# Altium schematic symbol library FPGA_Xilinx_Virtex7.SchLib: 34 symbols (part 34 of 34) (continued)
## XC7VX1140T-FLG1930 (continued)
part H pins: A27 VCCO_33 (power), A28 IO_L20P_T3_33 (io), A29 IO_L20N_T3_33 (io), A30 IO_L24N_T3_33 (io), AJ12 IO_L1P_T0_32 (io), AJ13 VCCO_32 (power), AK11 IO_0_VRN_32 (io), AK12 IO_L1N_T0_32 (io), AK13 IO_L2P_T0_32 (io), AL10 IO_L4N_T0_32 (io), AL11 IO_L4P_T0_32 (io), AL13 IO_L2N_T0_32 (io), AM10 IO_L6N_T0_VREF_32 (io), AM11 IO_L6P_T0_32 (io), AM12 IO_L3P_T0_DQS_32 (io), AM13 IO_L5P_T0_32 (io), AN10 IO_L8P_T1_32 (io), AN11 VCCO_32 (power), AN12 IO_L3N_T0_DQS_32 (io), AN13 IO_L5N_T0_32 (io), AN14 IO_25_VRP_32 (io), AP10 IO_L8N_T1_32 (io), AP11 IO_L10P_T1_32 (io), AP12 IO_L7P_T1_32 (io), AR11 IO_L10N_T1_32 (io), AR12 IO_L7N_T1_32 (io), AR13 IO_L9P_T1_DQS_32 (io), AT10 IO_L12N_T1_MRCC_32 (io), AT11 IO_L12P_T1_MRCC_32 (io), AT12 VCCO_32 (power), AT13 IO_L9N_T1_DQS_32 (io), AU10 IO_L13N_T2_MRCC_32 (io), AU11 IO_L13P_T2_MRCC_32 (io), AU12 IO_L11N_T1_SRCC_32 (io), AU13 IO_L11P_T1_SRCC_32 (io), AV10 IO_L15P_T2_DQS_32 (io), AV12 IO_L14N_T2_SRCC_32 (io), AV13 IO_L14P_T2_SRCC_32 (io), AW10 IO_L15N_T2_DQS_32 (io), AW11 IO_L17P_T2_32 (io), AW12 IO_L16P_T2_32 (io), AW13 VCCO_32 (power), AY10 VCCO_32 (power), AY11 IO_L17N_T2_32 (io), AY12 IO_L16N_T2_32 (io), AY13 IO_L18P_T2_32 (io), B27 IO_L23P_T3_33 (io), B28 IO_L23N_T3_33 (io), B30 IO_L24P_T3_33 (io), BA10 IO_L19N_T3_VREF_32 (io), BA11 IO_L19P_T3_32 (io), BA13 IO_L18N_T2_32 (io), BB10 IO_L21N_T3_DQS_32 (io), BB11 IO_L21P_T3_DQS_32 (io), BB12 IO_L20N_T3_32 (io), BB13 IO_L20P_T3_32 (io), BC10 IO_L23P_T3_32 (io), BC11 VCCO_32 (power), BC12 IO_L22N_T3_32 (io), BC13 IO_L22P_T3_32 (io), BD10 IO_L23N_T3_32 (io), BD11 IO_L24N_T3_32 (io), BD12 IO_L24P_T3_32 (io), C27 IO_L21P_T3_DQS_33 (io), C28 IO_L21N_T3_DQS_33 (io), C29 IO_L22P_T3_33 (io), C30 IO_L22N_T3_33 (io), D27 IO_L15N_T2_DQS_33 (io), D28 VCCO_33 (power), D29 IO_L19P_T3_33 (io), D30 IO_L19N_T3_VREF_33 (io), E27 IO_L15P_T2_DQS_33 (io), E28 IO_L17N_T2_33 (io), E29 IO_L16N_T2_33 (io), F28 IO_L17P_T2_33 (io), F29 IO_L16P_T2_33 (io), F30 IO_L18N_T2_33 (io), G27 IO_L14P_T2_SRCC_33 (io), G28 IO_L14N_T2_SRCC_33 (io), G29 VCCO_33 (power), G30 IO_L18P_T2_33 (io), H27 IO_L13P_T2_MRCC_33 (io), H28 IO_L13N_T2_MRCC_33 (io), H29 IO_L12P_T1_MRCC_33 (io), H30 IO_L12N_T1_MRCC_33 (io), J27 IO_L10N_T1_33 (io), J29 IO_L11P_T1_SRCC_33 (io), J30 IO_L11N_T1_SRCC_33 (io), K27 IO_L10P_T1_33 (io), K28 IO_L8N_T1_33 (io), K29 IO_L9N_T1_DQS_33 (io), K30 VCCO_33 (power), L27 VCCO_33 (power), L28 IO_L8P_T1_33 (io), L29 IO_L9P_T1_DQS_33 (io), M27 IO_L7P_T1_33 (io), M28 IO_L7N_T1_33 (io), N27 IO_L5P_T0_33 (io), N28 IO_L5N_T0_33 (io), N29 IO_25_VRP_33 (io), P26 IO_L4P_T0_33 (io), P27 IO_L4N_T0_33 (io), P28 VCCO_33 (power), P29 IO_L3N_T0_DQS_33 (io), R26 IO_L2N_T0_33 (io), R27 IO_L6P_T0_33 (io), R28 IO_L6N_T0_VREF_33 (io), R29 IO_L3P_T0_DQS_33 (io), T26 IO_L2P_T0_33 (io), T28 IO_L1P_T0_33 (io), T29 IO_L1N_T0_33 (io), U26 IO_0_VRN_33 (io), U29 VCCO_33 (power)
part I pins: A20 IO_L24N_T3_35 (io), A21 IO_L24P_T3_35 (io), A23 IO_L23N_T3_35 (io), A24 IO_L21P_T3_DQS_34 (io), A25 IO_L21N_T3_DQS_34 (io), A26 IO_L23N_T3_34 (io), B20 IO_L20N_T3_35 (io), B21 IO_L22N_T3_35 (io), B22 IO_L21N_T3_DQS_35 (io), B23 IO_L23P_T3_35 (io), B24 VCCO_34 (power), B25 IO_L24N_T3_34 (io), B26 IO_L23P_T3_34 (io), C20 IO_L20P_T3_35 (io), C21 VCCO_35 (power), C22 IO_L22P_T3_35 (io), C23 IO_L21P_T3_DQS_35 (io), C24 IO_L24P_T3_34 (io), C25 IO_L22N_T3_34 (io), D20 IO_L19N_T3_VREF_35 (io), D21 IO_L19P_T3_35 (io), D22 IO_L18N_T2_35 (io), D24 IO_L20N_T3_34 (io), D25 IO_L22P_T3_34 (io), D26 IO_L19N_T3_VREF_34 (io), E21 IO_L16N_T2_35 (io), E22 IO_L16P_T2_35 (io), E23 IO_L18P_T2_35 (io), E24 IO_L20P_T3_34 (io), E25 VCCO_34 (power), E26 IO_L19P_T3_34 (io), F20 IO_L15N_T2_DQS_35 (io), F21 IO_L17N_T2_35 (io), F22 VCCO_35 (power), F23 IO_L17N_T2_34 (io), F24 IO_L16P_T2_34 (io), F25 IO_L16N_T2_34 (io), F26 IO_L18N_T2_34 (io), G20 IO_L15P_T2_DQS_35 (io), G21 IO_L17P_T2_35 (io), G22 IO_L14N_T2_SRCC_35 (io), G23 IO_L17P_T2_34 (io), G25 IO_L15N_T2_DQS_34 (io), G26 IO_L18P_T2_34 (io), H20 IO_L13N_T2_MRCC_35 (io), H22 IO_L14P_T2_SRCC_35 (io), H23 IO_L13P_T2_MRCC_34 (io), H24 IO_L13N_T2_MRCC_34 (io), H25 IO_L15P_T2_DQS_34 (io), H26 VCCO_34 (power), J20 IO_L13P_T2_MRCC_35 (io), J21 IO_L12N_T1_MRCC_35 (io), J22 IO_L11N_T1_SRCC_35 (io), J23 VCCO_34 (power), J24 IO_L12N_T1_MRCC_34 (io), J25 IO_L14P_T2_SRCC_34 (io), J26 IO_L14N_T2_SRCC_34 (io), K20 VCCO_35 (power), K21 IO_L12P_T1_MRCC_35 (io), K22 IO_L11P_T1_SRCC_35 (io), K23 IO_L10N_T1_34 (io), K24 IO_L12P_T1_MRCC_34 (io), K26 IO_L11N_T1_SRCC_34 (io), L19 IO_L9N_T1_DQS_AD7N_35 (io), L20 IO_L9P_T1_DQS_AD7P_35 (io), L21 IO_L10N_T1_AD15N_35 (io), L23 IO_L10P_T1_34 (io), L24 IO_L7P_T1_34 (io), L25 IO_L7N_T1_34 (io), L26 IO_L11P_T1_SRCC_34 (io), M20 IO_L8N_T1_AD14N_35 (io), M21 IO_L10P_T1_AD15P_35 (io), M22 IO_L7N_T1_AD6N_35 (io), M23 IO_L8N_T1_34 (io), M24 VCCO_34 (power), M25 IO_L9P_T1_DQS_34 (io), M26 IO_L9N_T1_DQS_34 (io), N19 IO_L6N_T0_VREF_35 (io), N20 IO_L8P_T1_AD14P_35 (io), N21 VCCO_35 (power), N22 IO_L7P_T1_AD6P_35 (io), N23 IO_L8P_T1_34 (io), N24 IO_L1N_T0_34 (io), N25 IO_25_VRP_34 (io), P18 VCCO_35 (power), P19 IO_L4N_T0_35 (io), P20 IO_L6P_T0_35 (io), P21 IO_25_VRP_35 (io), P22 IO_L4N_T0_34 (io), P24 IO_L1P_T0_34 (io), P25 IO_L3N_T0_DQS_34 (io), R18 IO_L2N_T0_AD12N_35 (io), R19 IO_L4P_T0_35 (io), R21 IO_L5N_T0_AD13N_35 (io), R22 IO_L4P_T0_34 (io), R23 IO_L2N_T0_34 (io), R24 IO_L3P_T0_DQS_34 (io), R25 VCCO_34 (power), T18 IO_L2P_T0_AD12P_35 (io), T19 IO_L1N_T0_AD4N_35 (io), T20 IO_L1P_T0_AD4P_35 (io), T21 IO_L5P_T0_AD13P_35 (io), T22 VCCO_34 (power), T23 IO_L2P_T0_34 (io), T24 IO_L6N_T0_VREF_34 (io), T25 IO_L5N_T0_34 (io), U18 IO_0_VRN_35 (io), U19 VCCO_35 (power), U20 IO_L3N_T0_DQS_AD5N_35 (io), U21 IO_L3P_T0_DQS_AD5P_35 (io), U22 IO_0_VRN_34 (io), U23 IO_L6P_T0_34 (io), U25 IO_L5P_T0_34 (io)
part J pins: A3 IO_L1N_T0_36 (io), A4 IO_L1P_T0_36 (io), A5 IO_L4N_T0_36 (io), A6 IO_L2N_T0_36 (io), A7 VCCO_37 (power), A8 IO_L2N_T0_37 (io), A9 IO_L2P_T0_37 (io), A10 IO_L3N_T0_DQS_37 (io), A11 IO_L1N_T0_37 (io), B2 IO_L5N_T0_36 (io), B3 IO_L3N_T0_DQS_36 (io), B4 VCCO_36 (power), B5 IO_L4P_T0_36 (io), B6 IO_L2P_T0_36 (io), B7 IO_L4N_T0_37 (io), B8 IO_L4P_T0_37 (io), B10 IO_L3P_T0_DQS_37 (io), B11 IO_L1P_T0_37 (io), C1 VCCO_36 (power), C2 IO_L5P_T0_36 (io), C3 IO_L3P_T0_DQS_36 (io), C4 IO_L6N_T0_VREF_36 (io), C5 IO_L6P_T0_36 (io), C7 IO_L6N_T0_VREF_37 (io), C8 IO_L6P_T0_37 (io), C9 IO_L5N_T0_37 (io), C10 IO_L5P_T0_37 (io), C11 VCCO_37 (power), D1 IO_L7N_T1_36 (io), D2 IO_L7P_T1_36 (io), D4 IO_L10N_T1_36 (io), D5 IO_L8N_T1_36 (io), D6 IO_L10N_T1_37 (io), D7 IO_L10P_T1_37 (io), D8 VCCO_37 (power), D9 IO_L9N_T1_DQS_37 (io), D10 IO_L9P_T1_DQS_37 (io), D11 IO_L7N_T1_37 (io), E1 IO_L9N_T1_DQS_36 (io), E2 IO_L12N_T1_MRCC_36 (io), E3 IO_L12P_T1_MRCC_36 (io), E4 IO_L10P_T1_36 (io), E5 VCCO_36 (power), E6 IO_L8P_T1_36 (io), E7 IO_L12N_T1_MRCC_37 (io), E8 IO_L8N_T1_37 (io), E9 IO_L8P_T1_37 (io), E11 IO_L7P_T1_37 (io), F1 IO_L9P_T1_DQS_36 (io), F2 VCCO_36 (power), F3 IO_L11N_T1_SRCC_36 (io), F4 IO_L11P_T1_SRCC_36 (io), F5 IO_L13N_T2_MRCC_36 (io), F6 IO_L13P_T2_MRCC_36 (io), F8 IO_L12P_T1_MRCC_37 (io), F9 IO_L11N_T1_SRCC_37 (io), F10 IO_L11P_T1_SRCC_37 (io), F11 IO_L13N_T2_MRCC_37 (io), G1 IO_L18N_T2_36 (io), G2 IO_L14N_T2_SRCC_36 (io), G3 IO_L14P_T2_SRCC_36 (io), G5 IO_L15N_T2_DQS_36 (io), G6 IO_L15P_T2_DQS_36 (io), G7 IO_L14N_T2_SRCC_37 (io), G8 IO_L14P_T2_SRCC_37 (io), G9 VCCO_37 (power), G10 IO_L16N_T2_37 (io), G11 IO_L13P_T2_MRCC_37 (io), H2 IO_L18P_T2_36 (io), H3 IO_L16N_T2_36 (io), H4 IO_L16P_T2_36 (io), H5 IO_L17N_T2_36 (io), H6 VCCO_36 (power), H7 IO_L17N_T2_37 (io), H8 IO_L17P_T2_37 (io), H9 IO_L15N_T2_DQS_37 (io), H10 IO_L16P_T2_37 (io), J1 IO_L20N_T3_36 (io), J2 IO_L20P_T3_36 (io), J3 VCCO_36 (power), J4 IO_L19N_T3_VREF_36 (io), J5 IO_L19P_T3_36 (io), J6 IO_L17P_T2_36 (io), J7 IO_L20N_T3_37 (io), J9 IO_L15P_T2_DQS_37 (io), J10 IO_L18N_T2_37 (io), J11 IO_L18P_T2_37 (io), K1 IO_L22N_T3_36 (io), K2 IO_L23N_T3_36 (io), K3 IO_L21N_T3_DQS_36 (io), K4 IO_L21P_T3_DQS_36 (io), K6 IO_0_VRN_36 (io), K7 IO_L20P_T3_37 (io), K8 IO_L19N_T3_VREF_37 (io), K9 IO_L19P_T3_37 (io), K10 VCCO_37 (power), K11 IO_0_VRN_37 (io), L1 IO_L22P_T3_36 (io), L3 IO_L23P_T3_36 (io), L4 IO_25_VRP_36 (io), L5 IO_L24N_T3_36 (io), L6 IO_L24P_T3_36 (io), L7 VCCO_37 (power), L8 IO_L22N_T3_37 (io), L9 IO_L22P_T3_37 (io), L10 IO_L21N_T3_DQS_37 (io), L11 IO_L21P_T3_DQS_37 (io), M8 IO_25_VRP_37 (io), M10 IO_L23N_T3_37 (io), M11 IO_L23P_T3_37 (io), N10 IO_L24N_T3_37 (io), N11 VCCO_37 (power), P10 IO_L24P_T3_37 (io)
part K pins: A13 IO_L3N_T0_DQS_38 (io), A14 IO_L3P_T0_DQS_38 (io), A15 IO_L24N_T3_39 (io), A16 IO_L24P_T3_39 (io), A17 VCCO_39 (power), A18 IO_L23N_T3_39 (io), A19 IO_L23P_T3_39 (io), B12 IO_L2N_T0_38 (io), B13 IO_L5N_T0_38 (io), B14 VCCO_38 (power), B15 IO_L20N_T3_39 (io), B16 IO_L22N_T3_39 (io), B17 IO_L21N_T3_DQS_39 (io), B18 IO_L21P_T3_DQS_39 (io), C12 IO_L2P_T0_38 (io), C13 IO_L5P_T0_38 (io), C14 IO_L1N_T0_38 (io), C15 IO_L20P_T3_39 (io), C17 IO_L22P_T3_39 (io), C18 IO_L19N_T3_VREF_39 (io), C19 IO_L19P_T3_39 (io), D12 IO_L4N_T0_38 (io), D14 IO_L1P_T0_38 (io), D15 IO_L18N_T2_39 (io), D16 IO_L18P_T2_39 (io), D17 IO_L16N_T2_39 (io), D18 VCCO_39 (power), D19 IO_L17N_T2_39 (io), E12 IO_L4P_T0_38 (io), E13 IO_L6N_T0_VREF_38 (io), E14 IO_L6P_T0_38 (io), E15 VCCO_38 (power), E16 IO_L13N_T2_MRCC_39 (io), E17 IO_L16P_T2_39 (io), E18 IO_L15N_T2_DQS_39 (io), E19 IO_L17P_T2_39 (io), F12 VCCO_38 (power), F13 IO_L9N_T1_DQS_38 (io), F14 IO_L9P_T1_DQS_38 (io), F15 IO_L7N_T1_38 (io), F16 IO_L13P_T2_MRCC_39 (io), F18 IO_L14N_T2_SRCC_39 (io), F19 IO_L15P_T2_DQS_39 (io), G12 IO_L8N_T1_38 (io), G13 IO_L8P_T1_38 (io), G15 IO_L7P_T1_38 (io), G16 IO_L12N_T1_MRCC_39 (io), G17 IO_L12P_T1_MRCC_39 (io), G18 IO_L14P_T2_SRCC_39 (io), G19 VCCO_39 (power), H12 IO_L11N_T1_SRCC_38 (io), H13 IO_L11P_T1_SRCC_38 (io), H14 IO_L10N_T1_38 (io), H15 IO_L10P_T1_38 (io), H16 VCCO_39 (power), H17 IO_L11N_T1_SRCC_39 (io), H18 IO_L11P_T1_SRCC_39 (io), H19 IO_L10N_T1_39 (io), J12 IO_L14N_T2_SRCC_38 (io), J13 VCCO_38 (power), J14 IO_L12N_T1_MRCC_38 (io), J15 IO_L12P_T1_MRCC_38 (io), J16 IO_L7N_T1_39 (io), J17 IO_L7P_T1_39 (io), J19 IO_L10P_T1_39 (io), K12 IO_L14P_T2_SRCC_38 (io), K13 IO_L13N_T2_MRCC_38 (io), K14 IO_L13P_T2_MRCC_38 (io), K16 IO_L8N_T1_39 (io), K17 IO_L8P_T1_39 (io), K18 IO_L9N_T1_DQS_39 (io), K19 IO_L9P_T1_DQS_39 (io), L13 IO_L16N_T2_38 (io), L14 IO_L16P_T2_38 (io), L15 IO_L15N_T2_DQS_38 (io), L16 IO_L2N_T0_39 (io), L17 VCCO_39 (power), L18 IO_0_VRN_39 (io), M12 IO_L18N_T2_38 (io), M13 IO_L18P_T2_38 (io), M14 VCCO_38 (power), M15 IO_L15P_T2_DQS_38 (io), M16 IO_L2P_T0_39 (io), M17 IO_L1N_T0_39 (io), M18 IO_L1P_T0_39 (io), N12 IO_L19N_T3_VREF_38 (io), N13 IO_L19P_T3_38 (io), N14 IO_L17N_T2_38 (io), N15 IO_L17P_T2_38 (io), N17 IO_L3N_T0_DQS_39 (io), N18 IO_L3P_T0_DQS_39 (io), P11 IO_L20N_T3_38 (io), P12 IO_L20P_T3_38 (io), P14 IO_L21N_T3_DQS_38 (io), P15 IO_0_VRN_38 (io), P16 IO_L5N_T0_39 (io), P17 IO_L6N_T0_VREF_39 (io), R11 IO_25_VRP_38 (io), R12 IO_L22N_T3_38 (io), R13 IO_L22P_T3_38 (io), R14 IO_L21P_T3_DQS_38 (io), R15 VCCO_39 (power), R16 IO_L5P_T0_39 (io), R17 IO_L6P_T0_39 (io), T12 VCCO_38 (power), T13 IO_L23N_T3_38 (io), T14 IO_L23P_T3_38 (io), T15 IO_L24N_T3_38 (io), T16 IO_L4N_T0_39 (io), U15 IO_L24P_T3_38 (io), U16 IO_L4P_T0_39 (io), U17 IO_25_VRP_39 (io)
part L pins: AP3 MGTHTXN3_114 (io), AP4 MGTHTXP3_114 (io), AR1 MGTHTXN2_114 (io), AR2 MGTHTXP2_114 (io), AR5 MGTHRXN3_114 (io), AR6 MGTHRXP3_114 (io), AT3 MGTHRXN2_114 (io), AT4 MGTHRXP2_114 (io), AT7 MGTREFCLK0N_114 (io), AT8 MGTREFCLK0P_114 (io), AU1 MGTHTXN1_114 (io), AU2 MGTHTXP1_114 (io), AU5 MGTHRXN1_114 (io), AU6 MGTHRXP1_114 (io), AV3 MGTHTXN0_114 (io), AV4 MGTHTXP0_114 (io), AV7 MGTREFCLK1N_114 (io), AV8 MGTREFCLK1P_114 (io), AW1 MGTHTXN3_113 (io), AW2 MGTHTXP3_113 (io), AW5 MGTHRXN0_114 (io), AW6 MGTHRXP0_114 (io), AY3 MGTHRXN3_113 (io), AY4 MGTHRXP3_113 (io), AY7 MGTREFCLK0N_113 (io), AY8 MGTREFCLK0P_113 (io), BA1 MGTHTXN2_113 (io), BA2 MGTHTXP2_113 (io), BA5 MGTHRXN2_113 (io), BA6 MGTHRXP2_113 (io), BB3 MGTHTXN1_113 (io), BB4 MGTHTXP1_113 (io), BB7 MGTREFCLK1N_113 (io), BB8 MGTREFCLK1P_113 (io), BC5 MGTHRXN1_113 (io), BC6 MGTHRXP1_113 (io), BD3 MGTHTXN0_113 (io), BD4 MGTHTXP0_113 (io), BD7 MGTHRXN0_113 (io), BD8 MGTHRXP0_113 (io)
part M pins: AC1 MGTHTXN3_116 (io), AC2 MGTHTXP3_116 (io), AC5 MGTHRXN3_116 (io), AC6 MGTHRXP3_116 (io), AD7 MGTREFCLK0N_116 (io), AD8 MGTREFCLK0P_116 (io), AE1 MGTHTXN2_116 (io), AE2 MGTHTXP2_116 (io), AE5 MGTHRXN2_116 (io), AE6 MGTHRXP2_116 (io), AF3 MGTHTXN1_116 (io), AF4 MGTHTXP1_116 (io), AF7 MGTREFCLK1N_116 (io), AF8 MGTREFCLK1P_116 (io), AG1 MGTHTXN0_116 (io), AG2 MGTHTXP0_116 (io), AG5 MGTHRXN0_116 (io), AG6 MGTHRXP0_116 (io), AH3 MGTHRXN1_116 (io), AH4 MGTHRXP1_116 (io), AJ1 MGTHTXN3_115 (io), AJ2 MGTHTXP3_115 (io), AJ5 MGTHRXN3_115 (io), AJ6 MGTHRXP3_115 (io), AK3 MGTHTXN2_115 (io), AK4 MGTHTXP2_115 (io), AL1 MGTHTXN1_115 (io), AL2 MGTHTXP1_115 (io), AL5 MGTHRXN1_115 (io), AL6 MGTHRXP1_115 (io), AM3 MGTHRXN2_115 (io), AM4 MGTHRXP2_115 (io), AM7 MGTREFCLK0N_115 (io), AM8 MGTREFCLK0P_115 (io), AN1 MGTHTXN0_115 (io), AN2 MGTHTXP0_115 (io), AN5 MGTHRXN0_115 (io), AN6 MGTHRXP0_115 (io), AP7 MGTREFCLK1N_115 (io), AP8 MGTREFCLK1P_115 (io)
part N pins: AA1 MGTHTXN1_117 (io), AA2 MGTHTXP1_117 (io), AA5 MGTHRXN1_117 (io), AA6 MGTHRXP1_117 (io), AB3 MGTHTXN0_117 (io), AB4 MGTHTXP0_117 (io), AB7 MGTREFCLK1N_117 (io), AB8 MGTREFCLK1P_117 (io), AD3 MGTHRXN0_117 (io), AD4 MGTHRXP0_117 (io), N1 MGTHTXN3_118 (io), N2 MGTHTXP3_118 (io), N5 MGTHRXN3_118 (io), N6 MGTHRXP3_118 (io), P3 MGTHTXN2_118 (io), P4 MGTHTXP2_118 (io), R1 MGTHTXN1_118 (io), R2 MGTHTXP1_118 (io), R5 MGTHRXN2_118 (io), R6 MGTHRXP2_118 (io), T3 MGTHRXN1_118 (io), T4 MGTHRXP1_118 (io), T7 MGTREFCLK0N_118 (io), T8 MGTREFCLK0P_118 (io), U1 MGTHTXN0_118 (io), U2 MGTHTXP0_118 (io), U5 MGTHRXN0_118 (io), U6 MGTHRXP0_118 (io), V3 MGTHTXN3_117 (io), V4 MGTHTXP3_117 (io), V7 MGTREFCLK1N_118 (io), V8 MGTREFCLK1P_118 (io), W1 MGTHTXN2_117 (io), W2 MGTHTXP2_117 (io), W5 MGTHRXN3_117 (io), W6 MGTHRXP3_117 (io), Y3 MGTHRXN2_117 (io), Y4 MGTHRXP2_117 (io), Y7 MGTREFCLK0N_117 (io), Y8 MGTREFCLK0P_117 (io)
part O pins: AB2 MGTAVTT_G11 (power), AB6 MGTAVCC_G11 (power), AC4 MGTAVTT_G11 (power), AC8 MGTAVCC_G11 (power), AF2 MGTAVTT_G11 (power), AF6 MGTAVCC_G11 (power), AG4 MGTAVTT_G11 (power), AG8 MGTVCCAUX_G11 (power), AH6 MGTAVCC_G11 (power), AJ8 MGTVCCAUX_G10 (power), AK2 MGTAVTT_G10 (power), AK6 MGTAVCC_G10 (power), AK7 MGTAVTTRCAL_115 (power), AK8 MGTRREF_115 (power), AL4 MGTAVTT_G10 (power), AL8 MGTAVCC_G10 (power), AP2 MGTAVTT_G10 (power), AP6 MGTAVCC_G10 (power), AR4 MGTAVTT_G10 (power), AR8 MGTAVCC_G10 (power), AV2 MGTAVTT_G10 (power), AV6 MGTAVCC_G10 (power), AW4 MGTAVTT_G10 (power), AW8 MGTAVCC_G10 (power), BB2 MGTAVTT_G10 (power), BB6 MGTAVCC_G10 (power), BC4 MGTAVTT_G10 (power), BC8 MGTAVCC_G10 (power), P2 MGTAVTT_G11 (power), P6 MGTAVCC_G11 (power), P7 MGTAVTTRCAL_118 (power), P8 MGTRREF_118 (power), R4 MGTAVTT_G11 (power), R8 MGTAVCC_G11 (power), V2 MGTAVTT_G11 (power), V6 MGTAVCC_G11 (power), W4 MGTAVTT_G11 (power), W8 MGTAVCC_G11 (power)
part P pins: AA10 TDI_0 (io), AB11 TDO_0 (io), AB22 VREFN_0 (io), AB23 VP_0 (io), AC10 INIT_B_0 (io), AC22 VN_0 (io), AC23 VREFP_0 (io), AD11 DONE_0 (io), AD22 DXN_0 (io), AD23 DXP_0 (io), AE10 PROGRAM_B_0 (io), AF11 CFGBVS_0 (io), AG10 M2_0 (io), AH11 M0_0 (io), AJ10 M1_0 (io), AJ11 VCCO_0 (power), AK10 VCCO_0 (power), V11 CCLK_0 (io), W10 TCK_0 (io), Y11 TMS_0 (io)
part Q pins: A12 GND (power), A22 GND (power), A32 GND (power), A42 GND (power), AA11 VCCINT (power), AA13 VCCINT (power), AA15 VCCINT (power), AA17 VCCAUX (power), AA19 VCCAUX_IO_G6 (power), AA21 VCCINT (power), AA22 GNDADC (power), AA23 VCCADC (power), AA25 VCCAUX_IO_G2 (power), AA27 VCCAUX_IO_G1 (power), AA29 VCCINT (power), AA31 VCCINT (power), AA33 VCCINT (power), AB10 VCCINT (power), AB12 VCCINT (power), AB14 VCCINT (power), AB16 VCCINT (power), AB18 VCCAUX_IO_G6 (power), AB20 VCCINT (power), AB24 VCCBRAM (power), AB26 VCCAUX_IO_G1 (power), AB28 VCCAUX (power), AB30 VCCINT (power), AB32 VCCINT (power), AC11 VCCINT (power), AC13 VCCINT (power), AC15 VCCINT (power), AC17 VCCAUX (power), AC19 VCCAUX_IO_G5 (power), AC21 VCCINT (power), AC25 VCCBRAM (power), AC27 VCCAUX_IO_G1 (power), AC29 VCCINT (power), AC31 VCCINT (power), AC33 VCCINT (power), AD10 VCCINT (power), AD12 VCCINT (power), AD14 VCCINT (power), AD16 VCCINT (power), AD18 VCCAUX_IO_G5 (power), AD20 VCCINT (power), AD24 VCCBRAM (power), AD26 VCCAUX_IO_G0 (power), AD28 VCCAUX (power), AD30 VCCINT (power), AD32 VCCINT (power), AE11 VCCINT (power), AE13 VCCINT (power), AE15 VCCINT (power), AE17 VCCAUX (power), AE19 VCCAUX_IO_G5 (power), AE21 VCCINT (power), AE23 VCCBRAM (power), AE25 VCCBRAM (power), AE27 VCCAUX_IO_G0 (power), AE29 VCCINT (power), AE31 VCCINT (power), AE33 VCCINT (power), AF10 VCCINT (power), AF12 VCCINT (power), AF14 VCCINT (power), AF16 VCCINT (power), AF18 VCCAUX_IO_G4 (power), AF20 VCCAUX_IO_G4 (power), AF22 VCCINT (power), AF24 VCCBRAM (power), AF26 VCCAUX_IO_G0 (power), AF28 VCCAUX (power), AF30 VCCINT (power), AF32 VCCINT (power), AG11 VCCINT (power), AG13 VCCINT (power), AG15 VCCINT (power), AG17 VCCAUX (power), AG19 VCCAUX_IO_G4 (power), AG21 VCCINT (power), AG23 VCCINT (power), AG25 VCCBRAM (power), AG27 VCCAUX (power), AG29 VCCINT (power), AG31 VCCINT (power), AG33 VCCINT (power), AH10 VCCINT (power), AH12 VCCINT (power), B9 GND (power), B19 GND (power), B29 GND (power), B39 GND (power), C6 GND (power), C16 GND (power), C26 GND (power), C36 GND (power), D3 GND (power), D13 GND (power), D23 GND (power), D33 GND (power), D43 GND (power), E10 GND (power), E20 GND (power), E30 GND (power), E40 GND (power), F7 GND (power), F17 GND (power), F27 GND (power), F37 GND (power), G4 GND (power), G14 GND (power), G24 GND (power), G34 GND (power), G44 GND (power), H1 GND (power), H11 GND (power), H21 GND (power), H31 GND (power), H41 GND (power), J8 GND (power), J18 GND (power), J28 GND (power), J38 GND (power), K5 GND (power), K15 GND (power), K25 GND (power), K35 GND (power), L2 GND (power), L12 GND (power), L22 GND (power), L32 GND (power), L42 GND (power), M1 GND (power), M2 GND (power), M3 GND (power), M4 GND (power), M5 GND (power), M6 GND (power), M7 GND (power), M9 GND (power), M19 GND (power), M29 GND (power), M39 GND (power), N3 GND (power), N4 GND (power), N7 GND (power), N8 GND (power), N9 GND (power), N16 GND (power), N26 GND (power), N36 GND (power), P1 GND (power), P5 GND (power), P9 GND (power), P13 GND (power), P23 GND (power), P33 GND (power), P43 GND (power), R3 GND (power), R7 GND (power), R9 GND (power), R10 GND (power), R20 GND (power), R30 GND (power), R40 GND (power), T1 GND (power), T2 GND (power), T5 GND (power), T6 GND (power), T9 GND (power), T10 VCCINT (power), T11 GND (power), T17 GND (power), T27 GND (power), T37 GND (power), U3 GND (power), U4 GND (power), U7 GND (power), U8 GND (power), U9 GND (power), U10 VCCBATT_0 (power), U11 VCCINT (power), U12 GND (power), U13 VCCINT (power), U14 GND (power), U24 GND (power), U27 VCCAUX_IO_G3 (power), U28 GND (power), U34 GND (power), V10 VCCINT (power), V12 VCCINT (power), V14 VCCINT (power), V16 VCCINT (power), V18 VCCAUX (power), V20 VCCINT (power), V22 VCCINT (power), V24 VCCBRAM (power), V26 VCCAUX_IO_G3 (power), V28 VCCAUX (power), V30 VCCINT (power), V32 VCCINT (power), W11 VCCINT (power), W13 VCCINT (power), W15 VCCINT (power), W17 VCCAUX (power), W19 VCCAUX_IO_G7 (power), W21 VCCINT (power), W23 VCCBRAM (power), W25 VCCAUX_IO_G2 (power), W27 VCCAUX_IO_G3 (power), W29 VCCINT (power), W31 VCCINT (power), W33 VCCINT (power), Y10 VCCINT (power), Y12 VCCINT (power), Y14 VCCINT (power), Y16 VCCINT (power), Y18 VCCAUX_IO_G6 (power), Y20 VCCINT (power), Y22 VCCINT (power), Y24 VCCBRAM (power), Y26 VCCAUX_IO_G2 (power), Y28 VCCAUX (power), Y30 VCCINT (power), Y32 VCCINT (power)
part R pins: AA3 GND (power), AA4 GND (power), AA7 GND (power), AA8 GND (power), AA9 GND (power), AA12 GND (power), AA14 GND (power), AA16 GND (power), AA18 GND (power), AA20 GND (power), AA24 GND (power), AA26 GND (power), AA28 GND (power), AA30 GND (power), AA32 GND (power), AA42 GND (power), AB1 GND (power), AB5 GND (power), AB9 GND (power), AB13 GND (power), AB15 GND (power), AB17 GND (power), AB19 GND (power), AB21 GND (power), AB25 GND (power), AB27 GND (power), AB29 GND (power), AB31 GND (power), AB33 GND (power), AB39 GND (power), AC3 GND (power), AC7 GND (power), AC9 GND (power), AC12 GND (power), AC14 GND (power), AC16 GND (power), AC18 GND (power), AC20 GND (power), AC24 GND (power), AC26 GND (power), AC28 GND (power), AC30 GND (power), AC32 GND (power), AC36 GND (power), AD1 GND (power), AD2 GND (power), AD5 GND (power), AD6 GND (power), AD9 GND (power), AD13 GND (power), AD15 GND (power), AD17 GND (power), AD19 GND (power), AD21 GND (power), AD25 GND (power), AD27 GND (power), AD29 GND (power), AD31 GND (power), AD33 GND (power), AD43 GND (power), AE3 GND (power), AE4 GND (power), AE7 GND (power), AE8 GND (power), AE9 GND (power), AE12 GND (power), AE14 GND (power), AE16 GND (power), AE18 GND (power), AE20 GND (power), AE22 GND (power), AE24 GND (power), AE26 GND (power), AE28 GND (power), AE30 GND (power), AE32 GND (power), AE40 GND (power), AF1 GND (power), AF5 GND (power), AF9 GND (power), AF13 GND (power), AF15 GND (power), AF17 GND (power), AF19 GND (power), AF21 GND (power), AF23 GND (power), AF25 GND (power), AF27 GND (power), AF29 GND (power), AF31 GND (power), AF33 GND (power), AF37 GND (power), AG3 GND (power), AG7 GND (power), AG9 GND (power), AG12 GND (power), AG14 GND (power), AG16 GND (power), AG18 GND (power), AG20 GND (power), AG22 GND (power), AG24 GND (power), AG26 GND (power), AG28 GND (power), AG30 GND (power), AG32 GND (power), AG34 GND (power), AG44 GND (power), AH1 GND (power), AH2 GND (power), AH5 GND (power), AH7 GND (power), AH8 GND (power), AH9 GND (power), AH13 GND (power), AH21 GND (power), AH31 GND (power), AH33 GND (power), AH41 GND (power), AJ3 GND (power), AJ4 GND (power), AJ7 GND (power), AJ9 GND (power), AJ18 GND (power), AJ28 GND (power), AJ38 GND (power), AK1 GND (power), AK5 GND (power), AK9 GND (power), AK15 GND (power), AK25 GND (power), AK35 GND (power), AL3 GND (power), AL7 GND (power), AL9 GND (power), AL12 GND (power), AL22 GND (power), AL32 GND (power), AL42 GND (power), AM1 GND (power), AM2 GND (power), AM5 GND (power), AM6 GND (power), AM9 GND (power), AM19 GND (power), AM29 GND (power), AM39 GND (power), AN3 GND (power), AN4 GND (power), AN7 GND (power), AN8 GND (power), AN9 GND (power), AN16 GND (power), AN26 GND (power), AN36 GND (power), AP1 GND (power), AP5 GND (power), AP9 GND (power), AP13 GND (power), AP23 GND (power), AP33 GND (power), AP43 GND (power), AR3 GND (power), AR7 GND (power), AR9 GND (power), AR10 GND (power), AR20 GND (power), AR30 GND (power), AR40 GND (power), AT1 GND (power), AT2 GND (power), AT5 GND (power), AT6 GND (power), AT9 GND (power), AT17 GND (power), AT27 GND (power), AT37 GND (power), AU3 GND (power), AU4 GND (power), AU7 GND (power), AU8 GND (power), AU9 GND (power), AU14 GND (power), AU24 GND (power), AU34 GND (power), AU44 GND (power), AV1 GND (power), AV5 GND (power), AV9 GND (power), AV11 GND (power), AV21 GND (power), AV31 GND (power), AV41 GND (power), AW3 GND (power), AW7 GND (power), AW9 GND (power), AW18 GND (power), AW28 GND (power), AW38 GND (power), AY1 GND (power), AY2 GND (power), AY5 GND (power), AY6 GND (power), AY9 GND (power), AY15 GND (power), AY25 GND (power), AY35 GND (power), BA3 GND (power), BA4 GND (power), BA7 GND (power), BA8 GND (power), BA9 GND (power), BA12 GND (power), BA22 GND (power), BA32 GND (power), BA42 GND (power), BB1 GND (power), BB5 GND (power), BB9 GND (power), BB19 GND (power), BB29 GND (power), BB39 GND (power), BC2 GND (power), BC3 GND (power), BC7 GND (power), BC9 GND (power), BC16 GND (power), BC26 GND (power), BC36 GND (power), BD5 GND (power), BD6 GND (power), BD9 GND (power), BD13 GND (power), BD23 GND (power), BD33 GND (power), U44 GND (power), V1 GND (power), V5 GND (power), V9 GND (power), V13 GND (power), V15 GND (power), V17 GND (power), V19 GND (power), V21 GND (power), V23 GND (power), V25 GND (power), V27 GND (power), V29 GND (power), V31 GND (power), V33 GND (power), V41 GND (power), W3 GND (power), W7 GND (power), W9 GND (power), W12 GND (power), W14 GND (power), W16 GND (power), W18 GND (power), W20 GND (power), W22 GND (power), W24 GND (power), W26 GND (power), W28 GND (power), W30 GND (power), W32 GND (power), W38 GND (power), Y1 GND (power), Y2 GND (power), Y5 GND (power), Y6 GND (power), Y9 GND (power), Y13 GND (power), Y15 GND (power), Y17 GND (power), Y19 GND (power), Y21 GND (power), Y23 GND (power), Y25 GND (power), Y27 GND (power), Y29 GND (power), Y31 GND (power), Y33 GND (power), Y35 GND (power)